# Altium footprint library TEP_243-Altium_Library.PcbLib: 111 footprints (part 6 of 7)
Each footprint in its own frame and in the unit in brackets; x right, y up, seen from the top. Pads: shape width x height; smd on the part's side, far side on the other; paste and mask are expansions set on the pad; w line width, h text height; cw(c..) or ccw(c..) is an arc to the next point about the centre after c.
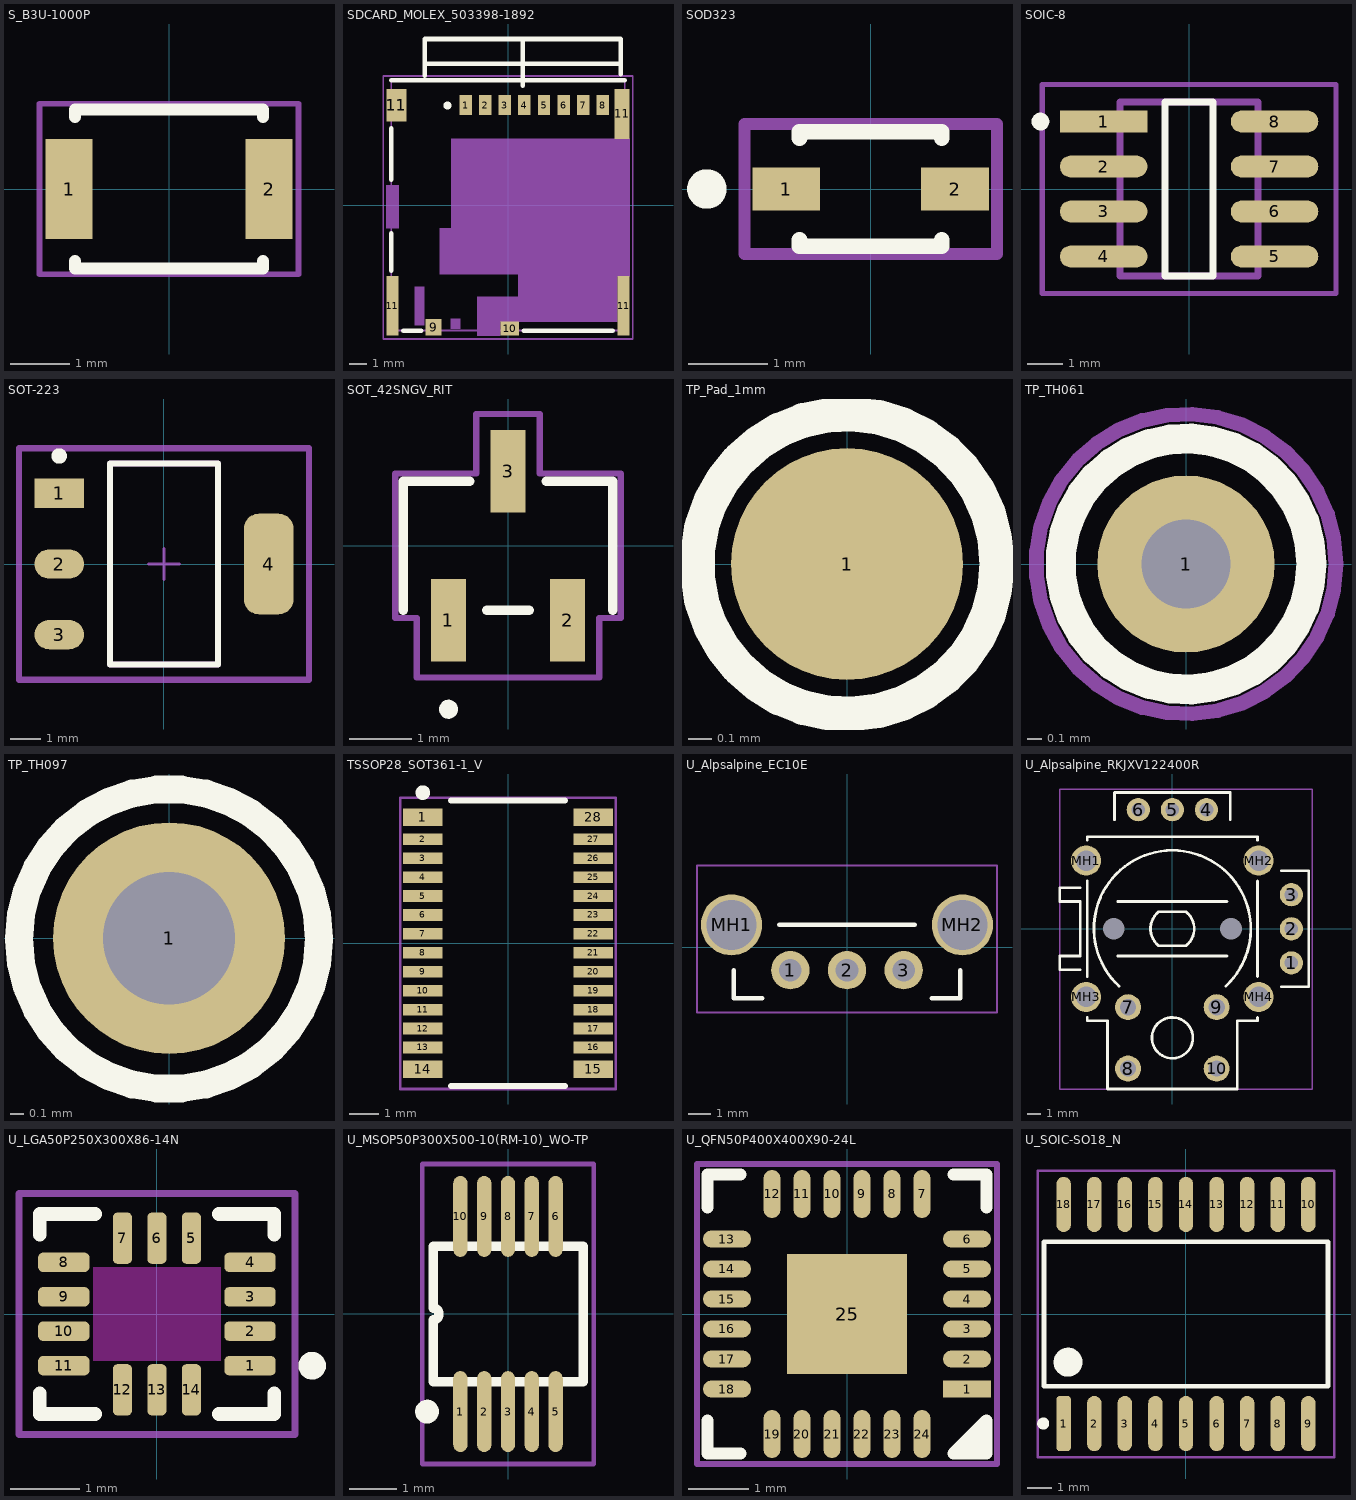
[diagram p5: the footprints below, top view; thin cyan lines are the x and y axes]

## S_B3U-1000P [mm]
pads (2):
  rect 0.8x1.7 smd paste+0 mask+0: 1(-1.7,0) 2(1.7,0)
Top Overlay:
  lines w0.2: -1.6,-1.225 -1.6,-1.35 1.6,-1.35 1.6,-1.225 ; -1.6,1.225 -1.6,1.35 1.6,1.35 1.6,1.225
Top Courtyard:
  lines w0.1: -2.2,-1.45 2.2,-1.45 2.2,1.45 -2.2,1.45 -2.2,-1.45
Top Designator:
  text ".Designator" at -1.25,-0.062 h1
3D body "Switch_Omron_B3U-1000P_eec.STEP": height 1.6, standoff 0, extent -2,-1.256 2,1.244

## SDCARD_MOLEX_503398-1892 [mm]
height 2.65
pads (14):
  rect 0.7x1.1 smd: 1(-2.38,5.625) 2(-1.28,5.625) 3(-0.18,5.625) 4(0.92,5.625) 5(2.02,5.625) 6(3.12,5.625) 7(4.22,5.625) 8(5.32,5.625)
  rect 0.9x0.93 smd: 9(-4.17,-6.84)
  rect 1.05x0.78 smd: 10(0.095,-6.915)
  rect 0.7x3.33 smd: 11(-6.48,-5.64) 11(6.48,-5.64)
  rect 1.14x1.83 smd: 11(-6.26,5.61)
  rect 0.86x2.8 smd: 11(6.4,5.125)
Top Overlay:
  circle w0.254: c-3.4,5.6 r0.1
  lines w0.254: -6.55,-3.675 -6.55,-1.575 ; -6.55,1.425 -6.55,4.325 ; -6.55,7.025 6.55,7.025 ; -5.876,-7.025 -4.874,-7.025 ; -4.67,7.28 -4.67,9.33 6.33,9.33 6.33,7.35 ; -4.67,7.93 6.33,7.93 ; 0.83,6.7 0.83,9.33 ; 0.874,-7.025 5.876,-7.025
Top Courtyard:
  circle w0.254: c-2.38,5.775 r0.1
  region: -2.67,-6.93 -3.223,-6.93 -3.223,-6.375 -2.67,-6.375
  region: -4.685,-6.73 -5.239,-6.73 -5.239,-4.575 -4.685,-4.575
  region: -6.13,-1.276 -6.836,-1.276 -6.836,1.125 -6.13,1.125
  region: 6.83,-3.975 6.13,-3.975 6.13,-6.525 -0.43,-6.525 -0.43,-7.305 -1.73,-7.305 -1.73,-5.125 0.57,-5.125 0.57,-3.875 -3.82,-3.875 -3.82,-1.275 -3.17,-1.275 -3.17,3.725 6.83,3.725
  region: -6.13,-1.277 -6.842,-1.277 -6.842,1.125 -6.13,1.125
  region: -4.685,-6.738 -5.245,-6.738 -5.245,-4.575 -4.685,-4.575
  region: -2.67,-6.937 -3.225,-6.937 -3.225,-6.375 -2.67,-6.375
  region: 6.83,-3.975 6.13,-3.975 6.13,-6.525 -0.43,-6.525 -0.43,-7.305 -1.73,-7.305 -1.73,-5.125 0.57,-5.125 0.57,-3.875 -3.82,-3.875 -3.82,-1.275 -3.17,-1.275 -3.17,3.725 6.83,3.725
  lines w0.1: -7,-7.5 7,-7.5 7,7.25 -7,7.25 -7,-7.5 ; -6.55,-7.025 -6.55,7.025 6.55,7.025 6.55,-7.025 -6.55,-7.025
Top Designator:
  text ".Designator" at -3.124,-0.212 h1.5
3D body "5033981892.stp": height 1.28, standoff 0, extent -6.477,-7.025 6.623,7.025

## SOD323 [mm]
height 1
pads (2):
  rect 0.86x0.54 smd paste+0 mask+0: 1(-1.07,0) 2(1.07,0)
Top Overlay:
  circle w0.25: c-2.075,0 r0.125
  lines w0.2: -0.9,-0.645 -0.9,-0.725 0.9,-0.725 0.9,-0.645 ; -0.9,0.645 -0.9,0.725 0.9,0.725 0.9,0.645
Top Courtyard:
  lines w0.15: -1.6,-0.825 1.6,-0.825 1.6,0.825 -1.6,0.825 -1.6,-0.825
Top Designator:
  text ".Designator" at 0,0.188 h1
3D body "Diode_STMicroelectronics_BAT60JFILM_eec.STEP": height 0.25, standoff 0, extent -1.6,-0.825 1.6,0.825

## SOIC-8 [mm]
height 5
pads (8):
  rect 2.469x0.622 smd paste+0 mask+0: 1(-2.414,1.905)
  rrect100% 2.469x0.622 smd paste+0 mask+0: 2(-2.414,0.635) 3(-2.414,-0.635) 4(-2.414,-1.905) 5(2.414,-1.905) 6(2.414,-0.635) 7(2.414,0.635) 8(2.414,1.905)
Top Overlay:
  circle w0.25: c-4.198,1.905 r0.125
  lines w0.2: -0.679,-2.452 -0.679,2.452 0.679,2.452 0.679,-2.452 -0.679,-2.452
Top Courtyard:
  lines w0.15: -4.148,-2.953 -4.148,2.953 4.148,2.953 4.148,-2.953 -4.148,-2.953
Top Designator:
  text ".Designator" at 0,0.188 h1
Top Component Outline:
  lines w0.2: -1.947,-2.452 1.947,-2.452 1.947,2.452 -1.947,2.452 -1.947,-2.452
3D body "IC_Texas_Instruments_ISO7220ADR_eec.STEP": height 0.25, standoff 0, extent -4.148,-2.953 4.148,2.953

## SOT-223 [mm]
height 1
pads (4):
  rect 1.604x0.952 smd paste+0 mask+0: 1(-3.395,2.29)
  rrect100% 1.604x0.952 smd paste+0 mask+0: 2(-3.395,0) 3(-3.395,-2.29)
  rrect59% 1.604x3.262 smd paste+0 mask+0: 4(3.395,0)
Top Overlay:
  circle w0.25: c-3.395,3.5 r0.125
  lines w0.2: -1.753,-3.253 -1.753,3.253 1.753,3.253 1.753,-3.253 -1.753,-3.253
Top Component Center:
  lines w0.1: -0.5,0 0.5,0 ; 0,-0.5 0,0.5
Top Courtyard:
  lines w0.2: -4.697,-3.752 -4.697,3.752 4.697,3.752 4.697,-3.752 -4.697,-3.752
Top Assembly:
  lines w0.2: -4.697,-3.752 4.697,-3.752 4.697,3.752 -4.697,3.752 -4.697,-3.752
Top Designator:
  text ".Designator" at 0,0.188 h1
Top 3D Body:
  lines w0.2: -1.753,-3.253 -1.753,3.253 1.753,3.253 1.753,-3.253 -1.753,-3.253
3D body "IC_Advanced_Monolithic_Systems_AMS1117-3_3_eec.STEP": height 0.25, standoff 0, extent -4.697,-3.752 4.697,3.752

## SOT_42SNGV_RIT [mil]
pads (3):
  rect 22x52 smd paste+0 mask+0: 1(-37.5,-47) 2(37.5,-47) 3(0,47)
Top Overlay:
  circle w6: c-37.5,-103 r3
  lines w6: -66,-40.5 -66,40.5 -24.1,40.5 ; -13.4,-40.5 13.4,-40.5 ; 24.1,40.5 66,40.5 66,-40.5
Top Courtyard:
  lines w3.94: -71,-45.5 -57.5,-45.5 -57.5,-83 57.5,-83 57.5,-45.5 71,-45.5 71,45.5 20,45.5 20,83 -20,83 -20,45.5 -71,45.5 -71,-45.5
Top Designator:
  text ".Designator" at -58.67,-8.9 h39.37
Top 3D Body:
  circle w0: c-37.5,-25.5 r3
3D body "SOT_42SNGV_RIT.step": height 51.1, standoff 0, extent -60.98,-59.02 60.98,59.02

## TP_Pad_1mm [mm]
pads (1):
  round 1 smd paste-1 mask+0: 1(0,0)
Top Overlay:
  circle w0.15: c0,0 r0.648

## TP_TH061 [mm] "Test point hole 0.61mm diameter (AWG28)"
height 0.01
pads (1):
  round 1.2 hole 0.6: 1(0,0)
Top Overlay:
  circle w0.203: c0,0 r0.85
Top Courtyard:
  circle w0.1: c0,0 r1.016

## TP_TH097 [mm] "Test point hole 0.97mm diameter (AWG22)"
height 0.01
pads (1):
  round 1.7 hole 0.97: 1(0,0)
Top Overlay:
  circle w0.203: c-0.001,-0.006 r1.1

## TSSOP28_SOT361-1_V [mm] "SOP, 28-Leads, Body 9.7x4.4mm, Pitch 0.65mm, NXP Recommended"
height 1.1
pads (28):
  rect 1.35x0.6 smd: 1(-2.925,4.325) 14(-2.925,-4.325) 15(2.925,-4.325) 28(2.925,4.325)
  rect 1.35x0.4 smd: 2(-2.925,3.575) 3(-2.925,2.925) 4(-2.925,2.275) 5(-2.925,1.625) 6(-2.925,0.975) 7(-2.925,0.325) 8(-2.925,-0.325) 9(-2.925,-0.975) 10(-2.925,-1.625) 11(-2.925,-2.275) 12(-2.925,-2.925) 13(-2.925,-3.575) 16(2.925,-3.575) 17(2.925,-2.925) 18(2.925,-2.275) 19(2.925,-1.625) 20(2.925,-0.975) 21(2.925,-0.325) 22(2.925,0.325) 23(2.925,0.975) 24(2.925,1.625) 25(2.925,2.275) 26(2.925,2.925) 27(2.925,3.575)
Top Overlay:
  circle w0.25: c-2.925,5.175 r0.125
  lines w0.2: -1.96,-4.9 1.96,-4.9 ; -1.96,4.9 1.96,4.9
Top Courtyard:
  lines w0.1: -3.7,-5 3.7,-5 3.7,5 -3.7,5 -3.7,-5
Top Designator:
  text ".Designator" at 0,0.188 h1
3D body "TSSOP28__SOT361-1__NXP.step": height 1.09, standoff 0, extent -3.302,-4.902 3.302,4.902

## U_Alpsalpine_EC10E [mm] "Rotary Encoder TH"
pads (5):
  round 1.7 hole 1 paste-2539.97 mask+0: 1(-2.5,-1) 2(0,-1) 3(2.5,-1)
  round 2.7 hole 2.2 paste-2539.97 mask+0: MH1(-5.1,1) MH2(5.1,1)
Top Overlay:
  lines w0.2: -5,-1 -5,-2.25 -3.75,-2.25 ; -3,1 3,1 ; 3.75,-2.25 5,-2.25 5,-1
Top Courtyard:
  lines w0.1: -6.625,-2.875 -6.625,3.625 6.625,3.625 6.625,-2.875 -6.625,-2.875
Top Designator:
  text ".Designator" at -3.239,0.913 h1.5
3D body "ec10e1220503.step": height 14.6, standoff -3.5, extent -5.571,-2.675 5.571,3.425

## U_Alpsalpine_RKJXV122400R [mm] "Thumb Stick TH"
pads (16):
  round 1.7 hole 1 paste-2539.97 mask+0: 1(8.73,-2.5) 2(8.73,0) 3(8.73,2.5) 4(2.5,8.73) 5(0,8.73) 6(-2.5,8.73)
  round 1.9 hole 1.2 paste-2539.97 mask+0: 7(-3.25,-5.75) 8(-3.25,-10.25) 9(3.25,-5.75) 10(3.25,-10.25)
  round 2.2 hole 1.5 paste-2539.97 mask+0: MH1(-6.325,5) MH2(6.325,5) MH3(-6.325,-5) MH4(6.325,-5)
  round 0.5 hole 1.6 unplated paste-2539.97 mask+0: PH1(-4.3,0) PH2(4.3,0)
Top Overlay:
  circle w0.2: c0,-8 r1.5
  lines w0.2: -6.75,-3 -8.25,-3 -8.25,-2 -6.75,-2 -6.75,2 -8.25,2 -8.25,3 -6.75,3 ; -6.25,-6.5 -6.25,-6.75 -4.75,-6.75 -4.75,-11.75 4.75,-11.75 4.75,-6.75 6.25,-6.75 6.25,-6.5 ; -6.25,-3.5 -6.25,3.5 ; -6.25,6.5 -6.25,6.75 6.25,6.75 6.25,6.5 ; -4.25,8 -4.25,10 4.25,10 4.25,8 ; -4,-2 4,-2 ; -4,2 4,2 ; -3.918,-4.208 cw(c0,0) 0,5.75 cw(c0,0) 3.918,-4.208 ; 6.25,-3.5 6.25,3.5 ; 8,-4.25 10,-4.25 10,4.25 8,4.25 ; -1,-1.25 cw(c0,0) -1,1.25 1,1.25 cw(c0,0) 1,-1.25 -1,-1.25
Top Courtyard:
  lines w0.1: -8.25,-11.75 10.25,-11.75 10.25,10.25 -8.25,10.25 -8.25,-11.75
Top Designator:
  text ".Designator" at -3.239,-0.087 h1.5
3D body "RKJXV122400R.STEP": height 18.95, standoff -2.9, extent -8.113,-11.6 10.075,10.075

## U_LGA50P250X300X86-14N [mm]
pads (14):
  rrect50% 0.745x0.28 smd mask+0: 1(1.35,-0.75) 2(1.35,-0.25) 3(1.35,0.25) 4(1.35,0.75) 8(-1.35,0.75) 9(-1.35,0.25) 10(-1.35,-0.25) 11(-1.35,-0.75)
  rrect50% 0.28x0.745 smd mask+0: 5(0.5,1.1) 6(0,1.1) 7(-0.5,1.1) 12(-0.5,-1.1) 13(0,-1.1) 14(0.5,-1.1)
Top Layer keep-out:
  region: 0.925,-0.675 -0.925,-0.675 -0.925,0.675 0.925,0.675
Top Overlay:
  circle w0.2: c2.25,-0.75 r0.1
  lines w0.2: -1.7,-1.15 -1.7,-1.45 -0.9,-1.45 ; -1.7,1.15 -1.7,1.45 -0.9,1.45 ; 0.9,-1.45 1.7,-1.45 1.7,-1.15 ; 0.9,1.45 1.7,1.45 1.7,1.15
Top Courtyard:
  lines w0.1: -2,-1.75 2,-1.75 2,1.75 -2,1.75 -2,-1.75
Top Designator:
  text ".Designator" at -2.489,-0.212 h1.5
3D body "User Library-LGA-14L.STEP": height 0.91, standoff 0.04, extent -1.5,-1.25 1.5,1.25

## U_MSOP50P300X500-10(RM-10)_WO-TP [mm] "Shrink Small Outline; 10 Leads; Body Width 3 mm; Pitch 0.5 mm"
height 1.1
pads (10):
  oval 0.3x1.7 smd mask+0.05: 1(-1,-2.05) 2(-0.5,-2.05) 3(0,-2.05) 4(0.5,-2.05) 5(1,-2.05) 6(1,2.05) 7(0.5,2.05) 8(0,2.05) 9(-0.5,2.05) 10(-1,2.05)
Top Overlay:
  circle w0.25: c-1.7,-2.05 r0.125
  lines w0.2: -1.575,-1.425 -1.575,-0.125 ccw(c-1.575,0) -1.575,0.125 -1.575,1.425 1.575,1.425 1.575,-1.425 -1.575,-1.425
Top Courtyard:
  lines w0.1: -1.8,-3.15 -1.8,3.15 1.8,3.15 1.8,-3.15 -1.8,-3.15
Top Designator:
  text ".Designator" at -1.809,-0.226 h1
3D body "User Library-MSOP10-1.STEP": height 1.09, standoff 0, extent -1.6,-2.575 1.6,2.575

## U_QFN50P400X400X90-24L [mm]
pads (25):
  rect 0.8x0.28 smd mask+0: 1(2,-1.25)
  rrect100% 0.8x0.28 smd mask+0: 2(2,-0.75) 3(2,-0.25) 4(2,0.25) 5(2,0.75) 6(2,1.25) 13(-2,1.25) 14(-2,0.75) 15(-2,0.25) 16(-2,-0.25) 17(-2,-0.75) 18(-2,-1.25)
  rrect100% 0.28x0.8 smd mask+0: 7(1.25,2) 8(0.75,2) 9(0.25,2) 10(-0.25,2) 11(-0.75,2) 12(-1.25,2) 19(-1.25,-2) 20(-0.75,-2) 21(-0.25,-2) 22(0.25,-2) 23(0.75,-2) 24(1.25,-2)
  rect 2x2 smd mask+0: 25(0,0)
Top Overlay:
  lines w0.2: -2.325,-1.775 -2.325,-2.325 -1.775,-2.325 ; -2.325,1.775 -2.325,2.325 -1.775,2.325 ; 1.775,2.325 2.325,2.325 2.325,1.775 ; 2.05,-2.325 2.325,-2.05 ; 1.775,-2.325 2.325,-2.325 2.325,-1.775 1.775,-2.325
Top Courtyard:
  lines w0.1: -2.5,-2.5 -2.5,2.5 2.5,2.5 2.5,-2.5 -2.5,-2.5
Top Designator:
  text ".Designator" at -2.978,-0.439 h1.5
3D body "User Library-QFN24 Punch.STEP": height 0.65, standoff -0.02, extent -2,-2 2,2

## U_SOIC-SO18_N [mm]
pads (18):
  rrect50% 0.6x2.3 smd: 1(-5.08,-4.55)
  oval 0.6x2.3 smd: 2(-3.81,-4.55) 3(-2.54,-4.55) 4(-1.27,-4.55) 5(0,-4.55) 6(1.27,-4.55) 7(2.54,-4.55) 8(3.81,-4.55) 9(5.08,-4.55) 10(5.08,4.55) 11(3.81,4.55) 12(2.54,4.55) 13(1.27,4.55) 14(0,4.55) 15(-1.27,4.55) 16(-2.54,4.55) 17(-3.81,4.55) 18(-5.08,4.55)
Top Overlay:
  circle w0.6: c-4.9,-2 r0.3
  circle w0.25: c-5.93,-4.55 r0.125
  lines w0.2: -5.9,-3 -5.9,3 5.9,3 5.9,-3 -5.9,-3
Top Courtyard:
  lines w0.1: -6.15,-5.95 6.15,-5.95 6.15,5.95 -6.15,5.95 -6.15,-5.95
Top Designator:
  text ".Designator" at -3.239,-0.337 h1.5
3D body "6466311P.stp": height 2.61, standoff 0, extent -5.75,-5.155 5.807,5.155